# Altium integrated library ALTIUM-TBL_5_08_2535_HORIZONTAL_ENTRY_W_RISING_CAGE_69125351000x-rev17b.IntLib: 81 symbols
Pins are listed as number, name and electrical type; pins without a type are passive.

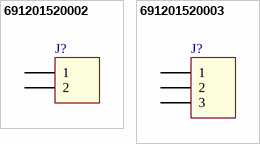
[diagram p0: symbols 691201520002 to 691201520003]

## 691201520002
designator J?
WR-TBL Serie 2015 - 5.08 mm 45° Entry Modular with Rising Cage Clamp, 2p; Part Number: 691201520002; Pitch: 5.08 mm; Pin Number: 2; ComponentLink1Description: Manufacturer; ComponentLink1URL: http://www.we-online.de; ComponentLink2Description: Datasheet; ComponentLink2URL: http://katalog.we-online.de/em/datasheet/6912015200XX.pdf; Published Date: March 2017; Publisher: Wurth Elektronik
footprint 691201520002 (Serie 2015 - 5.08 mm _ 2 pins)
pins: 1, 2

## 691201520003
designator J?
WR-TBL Serie 2015 - 5.08 mm 45° Entry Modular with Rising Cage Clamp, 3p; Part Number: 691201520003; Pitch: 5.08 mm; Pin Number: 3; ComponentLink1Description: Manufacturer; ComponentLink1URL: http://www.we-online.de; ComponentLink2Description: Datasheet; ComponentLink2URL: http://katalog.we-online.de/em/datasheet/6912015200XX.pdf; Published Date: March 2017; Publisher: Wurth Elektronik
footprint 691201520003 (Serie 2015 - 5.08 mm _ 3 pins)
pins: 1, 2, 3


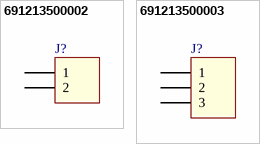
[diagram p1: symbols 691213500002 to 691213500003]

## 691213500002
designator J?
WR-TBL Serie 2135 - 5.08 mm Vertical Entry Modular with Rising Cage Clamp, 2p; Part Number: 691213500002; Pitch: 5.08 mm; Pin Number: 2; ComponentLink1Description: Manufacturer; ComponentLink1URL: http://www.we-online.de; ComponentLink2Description: Datasheet; ComponentLink2URL: http://katalog.we-online.de/em/datasheet/6912135000XX.pdf; Published Date: March 2017; Publisher: Wurth Elektronik
footprint 691213500002 (Serie 2135 - 5.08 mm _ 2 pins)
pins: 1, 2

## 691213500003
designator J?
WR-TBL Serie 2135 - 5.08 mm Vertical Entry Modular with Rising Cage Clamp, 3p; Part Number: 691213500003; Pitch: 5.08 mm; Pin Number: 3; ComponentLink1Description: Manufacturer; ComponentLink1URL: http://www.we-online.de; ComponentLink2Description: Datasheet; ComponentLink2URL: http://katalog.we-online.de/em/datasheet/6912135000XX.pdf; Published Date: March 2017; Publisher: Wurth Elektronik
footprint 691213500003 (Serie 2135 - 5.08 mm_ 3 pins)
pins: 1, 2, 3


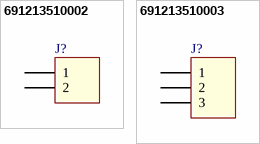
[diagram p2: symbols 691213510002 to 691213510003]

## 691213510002
designator J?
WR-TBL Serie 2135 - 5.08 mm Horizontal Entry Modular with Rising Cage Clamp, 2p; Part Number: 691213510002; Pitch: 5.08 mm; Pin Number: 2; ComponentLink1Description: Manufacturer; ComponentLink1URL: http://www.we-online.de; ComponentLink2Description: Datasheet; ComponentLink2URL: http://katalog.we-online.de/em/datasheet/6912135100XX.pdf; Published Date: March 2017; Publisher: Wurth Elektronik
footprint 691213510002 (Serie 2135 - 5.08 mm _ 2 pins)
pins: 1, 2

## 691213510003
designator J?
WR-TBL Serie 2135 - 5.08 mm Horizontal Entry Modular with Rising Cage Clamp, 3p; Part Number: 691213510003; Pitch: 5.08 mm; Pin Number: 3; ComponentLink1Description: Manufacturer; ComponentLink1URL: http://www.we-online.de; ComponentLink2Description: Datasheet; ComponentLink2URL: http://katalog.we-online.de/em/datasheet/6912135100XX.pdf; Published Date: March 2017; Publisher: Wurth Elektronik
footprint 691213510003 (Serie 2135 - 5.08 mm _ 3 pins)
pins: 1, 2, 3


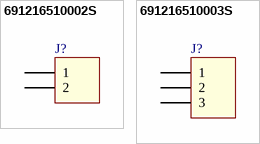
[diagram p3: symbols 691216510002S to 691216510003S]

## 691216510002S
designator J?
WR-TBL Serie 2165 S - 5.08 mm Horizontal Entry Modular with Rising Cage Clamp, 2p; Part Number: 691216510002S; Pitch: 5.08 mm; Pin Number: 2; ComponentLink1Description: Manufacturer; ComponentLink1URL: http://www.we-online.de; ComponentLink2Description: Datasheet; ComponentLink2URL: http://katalog.we-online.de/em/datasheet/6912165100XXS.pdf; Published Date: March 2017; Publisher: Wurth Elektronik
footprint 691216510002S (Serie 2165S - 5.08 mm _ 2 pins)
pins: 1, 2

## 691216510003S
designator J?
WR-TBL Serie 2165 S - 5.08 mm Horizontal Entry Modular with Rising Cage Clamp, 3p; Part Number: 691216510003S; Pitch: 5.08 mm; Pin Number: 3; ComponentLink1Description: Manufacturer; ComponentLink1URL: http://www.we-online.de; ComponentLink2Description: Datasheet; ComponentLink2URL: http://katalog.we-online.de/em/datasheet/6912165100XXS.pdf; Published Date: March 2017; Publisher: Wurth Elektronik
footprint 691216510003S (Serie 2165S - 5.08 mm _ 3 pins)
pins: 1, 2, 3


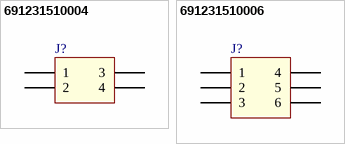
[diagram p4: symbols 691231510004 to 691231510006]

## 691231510004
designator J?
WR-TBL Serie 2315 - 5.08 mm Double Level, H=19.01mm, Horizontal Entry Modular with Rising Cage, 4p; Part Number: 691231510004; Pitch: 5.08 mm; Pin Number: 4; ComponentLink1Description: Manufacturer; ComponentLink1URL: http://www.we-online.de; ComponentLink2Description: Datasheet; ComponentLink2URL: http://katalog.we-online.de/em/datasheet/6912315100xx.pdf; Published Date: March 2017; Publisher: Wurth Elektronik
footprint 691231510004 (5,08mm - modular - 2 rows - Right - horizontal entry with rising cage clamp - 04p - h=19,1mm)
pins: 1, 2, 3, 4

## 691231510006
designator J?
WR-TBL Serie 2315 - 5.08 mm Double Level, H=19.01mm, Horizontal Entry Modular with Rising Cage, 6p; Part Number: 691231510006; Pitch: 5.08 mm; Pin Number: 6; ComponentLink1Description: Manufacturer; ComponentLink1URL: http://www.we-online.de; ComponentLink2Description: Datasheet; ComponentLink2URL: http://katalog.we-online.de/em/datasheet/6912315100xx.pdf; Published Date: March 2017; Publisher: Wurth Elektronik
footprint 691231510006 (5,08mm - modular - 2 rows - Right - horizontal entry with rising cage clamp - 06p - h=19,1mm)
pins: 1, 2, 3, 4, 5, 6


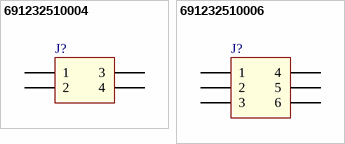
[diagram p5: symbols 691232510004 to 691232510006]

## 691232510004
designator J?
WR-TBL Serie 2325 - 5.08 mm Double Level, H=25.03mm, Horizontal Entry Modular with Rising Cage, 4p; Part Number: 691232510004; Pitch: 5.08 mm; Pin Number: 4; ComponentLink1Description: Manufacturer; ComponentLink1URL: http://www.we-online.de; ComponentLink2Description: Datasheet; ComponentLink2URL: http://katalog.we-online.de/em/datasheet/6912325100xx.pdf; Published Date: March 2017; Publisher: Wurth Elektronik
footprint 691232510004 (5,08mm - modular - 2 rows - Right - horizontal entry with rising cage clamp - 04p - h=25,3mm)
pins: 1, 2, 3, 4

## 691232510006
designator J?
WR-TBL Serie 2325 - 5.08 mm Double Level, H=25.03mm, Horizontal Entry Modular with Rising Cage, 6p; Part Number: 691232510006; Pitch: 5.08 mm; Pin Number: 6; ComponentLink1Description: Manufacturer; ComponentLink1URL: http://www.we-online.de; ComponentLink2Description: Datasheet; ComponentLink2URL: http://katalog.we-online.de/em/datasheet/6912325100xx.pdf; Published Date: March 2017; Publisher: Wurth Elektronik
footprint 691232510006 (5,08mm - modular - 2 rows - Right - horizontal entry with rising cage clamp - 06p - h=25,3mm)
pins: 1, 2, 3, 4, 5, 6


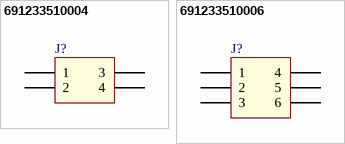
[diagram p6: symbols 691233510004 to 691233510006]

## 691233510004
designator J?
WR-TBL Serie 2335 - 5.08 mm Double Level, H=31.05mm, Horizontal Entry Modular with Rising Cage, 4p; Part Number: 691233510004; Pitch: 5.08 mm; Pin Number: 4; ComponentLink1Description: Manufacturer; ComponentLink1URL: http://www.we-online.de; ComponentLink2Description: Datasheet; ComponentLink2URL: http://katalog.we-online.de/em/datasheet/6912335100XX.pdf; Published Date: March 2017; Publisher: Wurth Elektronik
footprint 691233510004 (5,08mm - modular - 2 rows - Right - horizontal entry with rising cage clamp - 04p - h=31,5mm)
pins: 1, 2, 3, 4

## 691233510006
designator J?
WR-TBL Serie 2335 - 5.08 mm Double Level, H=31.05mm, Horizontal Entry Modular with Rising Cage, 6p; Part Number: 691233510006; Pitch: 5.08 mm; Pin Number: 6; ComponentLink1Description: Manufacturer; ComponentLink1URL: http://www.we-online.de; ComponentLink2Description: Datasheet; ComponentLink2URL: http://katalog.we-online.de/em/datasheet/6912335100XX.pdf; Published Date: March 2017; Publisher: Wurth Elektronik
footprint 691233510006 (5,08mm - modular - 2 rows - Right - horizontal entry with rising cage clamp - 06p - h=31,5mm)
pins: 1, 2, 3, 4, 5, 6


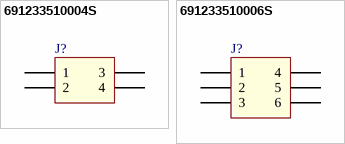
[diagram p7: symbols 691233510004S to 691233510006S]

## 691233510004S
designator J?
WR-TBL Serie 2335 S - 5.08 mm Horizontal Entry with Rising Cage Clamp, 4p; Part Number: 691233510004S; Pitch: 5.08 mm; Pin Number: 4; ComponentLink1Description: Manufacturer; ComponentLink1URL: http://www.we-online.de; ComponentLink2Description: Datasheet; ComponentLink2URL: http://katalog.we-online.de/em/datasheet/691233510004S.pdf; Published Date: April 2017; Publisher: Wurth Elektronik
footprint 691233510004S (5.08 mm Horizontal Entry with Rising Cage Clamp, 4p)
pins: 1, 2, 3, 4

## 691233510006S
designator J?
WR-TBL Serie 2335 S - 5.08 mm Horizontal Entry with Rising Cage Clamp, 6p; Part Number: 691233510006S; Pitch: 5.08 mm; Pin Number: 6; ComponentLink1Description: Manufacturer; ComponentLink1URL: http://www.we-online.de; ComponentLink2Description: Datasheet; ComponentLink2URL: http://katalog.we-online.de/em/datasheet/691233510004S.pdf; Published Date: April 2017; Publisher: Wurth Elektronik
footprint 691233510006S (5.08 mm Horizontal Entry with Rising Cage Clamp, 6p)
pins: 1, 2, 3, 4, 5, 6


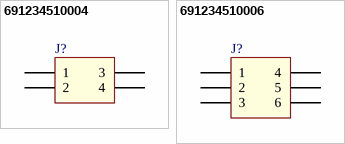
[diagram p8: symbols 691234510004 to 691234510006]

## 691234510004
designator J?
WR-TBL Serie 2345 - 5.08 mm Horizontal Entry with Rising Cage Clamp, 4p; Part Number: 691234510004; Pitch: 5.08 mm; Pin Number: 4; ComponentLink1Description: Manufacturer; ComponentLink1URL: http://www.we-online.de; ComponentLink2Description: Datasheet; ComponentLink2URL: http://katalog.we-online.de/em/datasheet/6912345100xx.pdf; Published Date: March 2017; Publisher: Wurth Elektronik
footprint 691234510004 (Horizontal Cable Entry with Rising Cage Clamp, pitch 5.08mm, 04p)
pins: 1, 2, 3, 4

## 691234510006
designator J?
WR-TBL Serie 2345 - 5.08 mm Horizontal Entry with Rising Cage Clamp, 6p; Part Number: 691234510006; Pitch: 5.08 mm; Pin Number: 6; ComponentLink1Description: Manufacturer; ComponentLink1URL: http://www.we-online.de; ComponentLink2Description: Datasheet; ComponentLink2URL: http://katalog.we-online.de/em/datasheet/6912345100xx.pdf; Published Date: March 2017; Publisher: Wurth Elektronik
footprint 691234510006 (Horizontal Cable Entry with Rising Cage Clamp, pitch 5.08mm, 06p)
pins: 1, 2, 3, 4, 5, 6


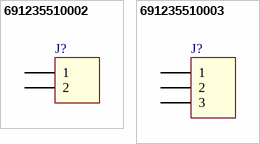
[diagram p9: symbols 691235510002 to 691235510003]

## 691235510002
designator J?
WR-TBL Serie 2355 - 5.08 mm Horizontal Entry with Rising Cage Clamp, 2p; Part Number: 691235510002; Pitch: 5.08 mm; Pin Number: 2; ComponentLink1Description: Manufacturer; ComponentLink1URL: http://www.we-online.de; ComponentLink2Description: Datasheet; ComponentLink2URL: http://katalog.we-online.de/em/datasheet/6912355100xx.pdf; Published Date: March 2017; Publisher: Wurth Elektronik
footprint 691235510002 (Horizontal Cable Entry with Rising Cage Clamp, pitch 5.08, 02p)
pins: 1, 2

## 691235510003
designator J?
WR-TBL Serie 2355 - 5.08 mm Horizontal Entry with Rising Cage Clamp, 3p; Part Number: 691235510003; Pitch: 5.08 mm; Pin Number: 3; ComponentLink1Description: Manufacturer; ComponentLink1URL: http://www.we-online.de; ComponentLink2Description: Datasheet; ComponentLink2URL: http://katalog.we-online.de/em/datasheet/6912355100xx.pdf; Published Date: March 2017; Publisher: Wurth Elektronik
footprint 691235510003 (Horizontal Cable Entry with Rising Cage Clamp, pitch 5.08, 03p)
pins: 1, 2, 3


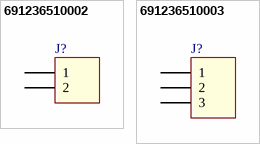
[diagram p10: symbols 691236510002 to 691236510003]

## 691236510002
designator J?
WR-TBL Serie 2365 - 5.08 mm Horizontal Entry with Rising Cage Clamp, 2p; Part Number: 691236510002; Pitch: 5.08 mm; Pin Number: 2; ComponentLink1Description: Manufacturer; ComponentLink1URL: http://www.we-online.de; ComponentLink2Description: Datasheet; ComponentLink2URL: http://katalog.we-online.de/em/datasheet/6912365100xx.pdf; Published Date: March 2017; Publisher: Wurth Elektronik
footprint 691236510002 (Horizontal Cable Entry with Rising Cage Clamp, pitch 5.08mm, 02p)
pins: 1, 2

## 691236510003
designator J?
WR-TBL Serie 2365 - 5.08 mm Horizontal Entry with Rising Cage Clamp, 3p; Part Number: 691236510003; Pitch: 5.08 mm; Pin Number: 3; ComponentLink1Description: Manufacturer; ComponentLink1URL: http://www.we-online.de; ComponentLink2Description: Datasheet; ComponentLink2URL: http://katalog.we-online.de/em/datasheet/6912365100xx.pdf; Published Date: March 2017; Publisher: Wurth Elektronik
footprint 691236510003 (Horizontal Cable Entry with Rising Cage Clamp, pitch 5.08mm, 03p)
pins: 1, 2, 3


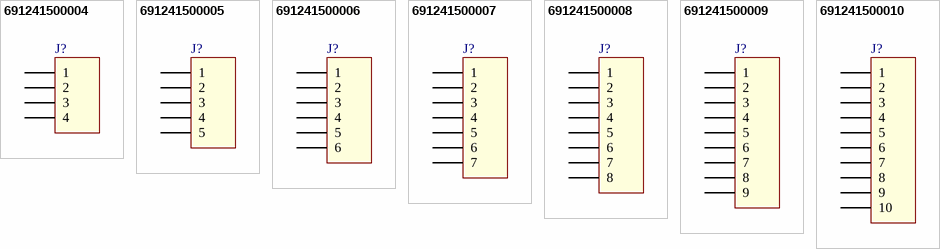
[diagram p11: symbols 691241500004 to 691241500010]

## 691241500004
designator J?
WR-TBL Serie 2415 - 5.08 mm Vertical Entry Modular with Rising Cage Clamp, 4p; Part Number: 691241500004; Pitch: 5.08 mm; Pin Number: 4; ComponentLink1Description: Manufacturer; ComponentLink1URL: http://www.we-online.de; ComponentLink2Description: Datasheet; ComponentLink2URL: http://katalog.we-online.de/em/datasheet/6912415000xx.pdf; Published Date: March 2017; Publisher: Wurth Elektronik
footprint 691241500004 (Serie 2415-5.08mm Vertical Cable Entry with Rising Cage Clamp, 4 pins)
pins: 1, 2, 3, 4

## 691241500005
designator J?
WR-TBL Serie 2415 - 5.08 mm Vertical Entry Modular with Rising Cage Clamp, 5p; Part Number: 691241500005; Pitch: 5.08 mm; Pin Number: 5; ComponentLink1Description: Manufacturer; ComponentLink1URL: http://www.we-online.de; ComponentLink2Description: Datasheet; ComponentLink2URL: http://katalog.we-online.de/em/datasheet/6912415000xx.pdf; Published Date: March 2017; Publisher: Wurth Elektronik
footprint 691241500005 (Serie 2415-5.08mm Vertical Cable Entry with Rising Cage Clamp, 5 pins)
pins: 1, 2, 3, 4, 5

## 691241500006
designator J?
WR-TBL Serie 2415 - 5.08 mm Vertical Entry Modular with Rising Cage Clamp, 6p; Part Number: 691241500006; Pitch: 5.08 mm; Pin Number: 6; ComponentLink1Description: Manufacturer; ComponentLink1URL: http://www.we-online.de; ComponentLink2Description: Datasheet; ComponentLink2URL: http://katalog.we-online.de/em/datasheet/6912415000xx.pdf; Published Date: March 2017; Publisher: Wurth Elektronik
footprint 691241500006 (Serie 2415-5.08mm Vertical Cable Entry with Rising Cage Clamp, 6 pins)
pins: 1, 2, 3, 4, 5, 6

## 691241500007
designator J?
WR-TBL Serie 2415 - 5.08 mm Vertical Entry Modular with Rising Cage Clamp, 7p; Part Number: 691241500007; Pitch: 5.08 mm; Pin Number: 7; ComponentLink1Description: Manufacturer; ComponentLink1URL: http://www.we-online.de; ComponentLink2Description: Datasheet; ComponentLink2URL: http://katalog.we-online.de/em/datasheet/6912415000xx.pdf; Published Date: March 2017; Publisher: Wurth Elektronik
footprint 691241500007 (Serie 2415-5.08mm Vertical Cable Entry with Rising Cage Clamp, 7 pins)
pins: 1, 2, 3, 4, 5, 6, 7

## 691241500008
designator J?
WR-TBL Serie 2415 - 5.08 mm Vertical Entry Modular with Rising Cage Clamp, 8p; Part Number: 691241500008; Pitch: 5.08 mm; Pin Number: 8; ComponentLink1Description: Manufacturer; ComponentLink1URL: http://www.we-online.de; ComponentLink2Description: Datasheet; ComponentLink2URL: http://katalog.we-online.de/em/datasheet/6912415000xx.pdf; Published Date: March 2017; Publisher: Wurth Elektronik
footprint 691241500008 (Serie 2415-5.08mm Vertical Cable Entry with Rising Cage Clamp, 8 pins)
pins: 1, 2, 3, 4, 5, 6, 7, 8

## 691241500009
designator J?
WR-TBL Serie 2415 - 5.08 mm Vertical Entry Modular with Rising Cage Clamp, 9p; Part Number: 691241500009; Pitch: 5.08 mm; Pin Number: 9; ComponentLink1Description: Manufacturer; ComponentLink1URL: http://www.we-online.de; ComponentLink2Description: Datasheet; ComponentLink2URL: http://katalog.we-online.de/em/datasheet/6912415000xx.pdf; Published Date: March 2017; Publisher: Wurth Elektronik
footprint 691241500009 (Serie 2415-5.08mm Vertical Cable Entry with Rising Cage Clamp, 9 pins)
pins: 1, 2, 3, 4, 5, 6, 7, 8, 9

## 691241500010
designator J?
WR-TBL Serie 2415 - 5.08 mm Vertical Entry Modular with Rising Cage Clamp, 10p; Part Number: 691241500010; Pitch: 5.08 mm; Pin Number: 10; ComponentLink1Description: Manufacturer; ComponentLink1URL: http://www.we-online.de; ComponentLink2Description: Datasheet; ComponentLink2URL: http://katalog.we-online.de/em/datasheet/6912415000xx.pdf; Published Date: March 2017; Publisher: Wurth Elektronik
footprint 691241500010 (Serie 2415-5.08mm Vertical Cable Entry with Rising Cage Clamp, 10 pins)
pins: 1, 2, 3, 4, 5, 6, 7, 8, 9, 10


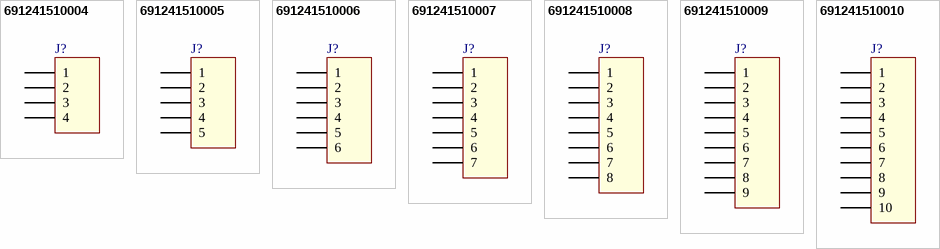
[diagram p12: symbols 691241510004 to 691241510010]

## 691241510004
designator J?
WR-TBL Serie 2415 - 5.08 mm Horizontal Entry Modular with Rising Cage Clamp, 4p; Part Number: 691241510004; Pitch: 5.08 mm; Pin Number: 4; ComponentLink1Description: Manufacturer; ComponentLink1URL: http://www.we-online.de; ComponentLink2Description: Datasheet; ComponentLink2URL: http://katalog.we-online.de/em/datasheet/6912415100xx.pdf; Published Date: March 2017; Publisher: Wurth Elektronik
footprint 691241510004 (Serie 2415 - 5.08 mm _ 4 pins)
pins: 1, 2, 3, 4

## 691241510005
designator J?
WR-TBL Serie 2415 - 5.08 mm Horizontal Entry Modular with Rising Cage Clamp, 5p; Part Number: 691241510005; Pitch: 5.08 mm; Pin Number: 5; ComponentLink1Description: Manufacturer; ComponentLink1URL: http://www.we-online.de; ComponentLink2Description: Datasheet; ComponentLink2URL: http://katalog.we-online.de/em/datasheet/6912415100xx.pdf; Published Date: March 2017; Publisher: Wurth Elektronik
footprint 691241510005 (Serie 2415 - 5.08 mm _ 5 pins)
pins: 1, 2, 3, 4, 5

## 691241510006
designator J?
WR-TBL Serie 2415 - 5.08 mm Horizontal Entry Modular with Rising Cage Clamp, 6p; Part Number: 691241510006; Pitch: 5.08 mm; Pin Number: 6; ComponentLink1Description: Manufacturer; ComponentLink1URL: http://www.we-online.de; ComponentLink2Description: Datasheet; ComponentLink2URL: http://katalog.we-online.de/em/datasheet/6912415100xx.pdf; Published Date: March 2017; Publisher: Wurth Elektronik
footprint 691241510006 (Serie 2415 - 5.08 mm _ 6 pins)
pins: 1, 2, 3, 4, 5, 6

## 691241510007
designator J?
WR-TBL Serie 2415 - 5.08 mm Horizontal Entry Modular with Rising Cage Clamp, 7p; Part Number: 691241510007; Pitch: 5.08 mm; Pin Number: 7; ComponentLink1Description: Manufacturer; ComponentLink1URL: http://www.we-online.de; ComponentLink2Description: Datasheet; ComponentLink2URL: http://katalog.we-online.de/em/datasheet/6912415100xx.pdf; Published Date: March 2017; Publisher: Wurth Elektronik
footprint 691241510007 (Serie 2415 - 5.08 mm _ 7 pins)
pins: 1, 2, 3, 4, 5, 6, 7

## 691241510008
designator J?
WR-TBL Serie 2415 - 5.08 mm Horizontal Entry Modular with Rising Cage Clamp, 8p; Part Number: 691241510008; Pitch: 5.08 mm; Pin Number: 8; ComponentLink1Description: Manufacturer; ComponentLink1URL: http://www.we-online.de; ComponentLink2Description: Datasheet; ComponentLink2URL: http://katalog.we-online.de/em/datasheet/6912415100xx.pdf; Published Date: March 2017; Publisher: Wurth Elektronik
footprint 691241510008 (Serie 2415 - 5.08 mm _ 8 pins)
pins: 1, 2, 3, 4, 5, 6, 7, 8

## 691241510009
designator J?
WR-TBL Serie 2415 - 5.08 mm Horizontal Entry Modular with Rising Cage Clamp, 9p; Part Number: 691241510009; Pitch: 5.08 mm; Pin Number: 9; ComponentLink1Description: Manufacturer; ComponentLink1URL: http://www.we-online.de; ComponentLink2Description: Datasheet; ComponentLink2URL: http://katalog.we-online.de/em/datasheet/6912415100xx.pdf; Published Date: March 2017; Publisher: Wurth Elektronik
footprint 691241510009 (Serie 2415 - 5.08 mm _ 9 pins)
pins: 1, 2, 3, 4, 5, 6, 7, 8, 9

## 691241510010
designator J?
WR-TBL Serie 2415 - 5.08 mm Horizontal Entry Modular with Rising Cage Clamp, 10p; Part Number: 691241510010; Pitch: 5.08 mm; Pin Number: 10; ComponentLink1Description: Manufacturer; ComponentLink1URL: http://www.we-online.de; ComponentLink2Description: Datasheet; ComponentLink2URL: http://katalog.we-online.de/em/datasheet/6912415100xx.pdf; Published Date: March 2017; Publisher: Wurth Elektronik
footprint 691241510010 (Serie 2415 - 5.08 mm _ 10 pins)
pins: 1, 2, 3, 4, 5, 6, 7, 8, 9, 10


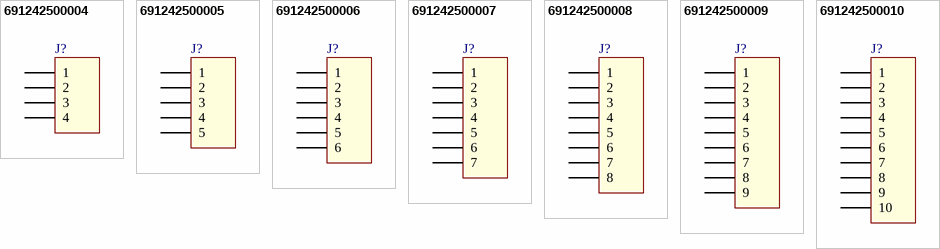
[diagram p13: symbols 691242500004 to 691242500010]

## 691242500004
designator J?
WR-TBL Serie 2425 - 5.08 mm Vertical Entry with Rising Cage Clamp, 4p; Part Number: 691242500004; Pitch: 5.08 mm; Pin Number: 4; ComponentLink1Description: Manufacturer; ComponentLink1URL: http://www.we-online.de; ComponentLink2Description: Datasheet; ComponentLink2URL: http://katalog.we-online.de/em/datasheet/6912425000xx.pdf; Published Date: March 2017; Publisher: Wurth Elektronik
footprint 691242500004 (Serie 2425-5.08mm Vertical Cable Entry with Rising Cage Clamp, 4 pins)
pins: 1, 2, 3, 4

## 691242500005
designator J?
WR-TBL Serie 2425 - 5.08 mm Vertical Entry with Rising Cage Clamp, 5p; Part Number: 691242500005; Pitch: 5.08 mm; Pin Number: 5; ComponentLink1Description: Manufacturer; ComponentLink1URL: http://www.we-online.de; ComponentLink2Description: Datasheet; ComponentLink2URL: http://katalog.we-online.de/em/datasheet/6912425000xx.pdf; Published Date: March 2017; Publisher: Wurth Elektronik
footprint 691242500005 (Serie 2425-5.08mm Vertical Cable Entry with Rising Cage Clamp, 5 pins)
pins: 1, 2, 3, 4, 5

## 691242500006
designator J?
WR-TBL Serie 2425 - 5.08 mm Vertical Entry with Rising Cage Clamp, 6p; Part Number: 691242500006; Pitch: 5.08 mm; Pin Number: 6; ComponentLink1Description: Manufacturer; ComponentLink1URL: http://www.we-online.de; ComponentLink2Description: Datasheet; ComponentLink2URL: http://katalog.we-online.de/em/datasheet/6912425000xx.pdf; Published Date: March 2017; Publisher: Wurth Elektronik
footprint 691242500006 (Serie 2425-5.08mm Vertical Cable Entry with Rising Cage Clamp, 6 pins)
pins: 1, 2, 3, 4, 5, 6

## 691242500007
designator J?
WR-TBL Serie 2425 - 5.08 mm Vertical Entry with Rising Cage Clamp, 7p; Part Number: 691242500007; Pitch: 5.08 mm; Pin Number: 7; ComponentLink1Description: Manufacturer; ComponentLink1URL: http://www.we-online.de; ComponentLink2Description: Datasheet; ComponentLink2URL: http://katalog.we-online.de/em/datasheet/6912425000xx.pdf; Published Date: March 2017; Publisher: Wurth Elektronik
footprint 691242500007 (Serie 2425-5.08mm Vertical Cable Entry with Rising Cage Clamp, 7 pins)
pins: 1, 2, 3, 4, 5, 6, 7

## 691242500008
designator J?
WR-TBL Serie 2425 - 5.08 mm Vertical Entry with Rising Cage Clamp, 8p; Part Number: 691242500008; Pitch: 5.08 mm; Pin Number: 8; ComponentLink1Description: Manufacturer; ComponentLink1URL: http://www.we-online.de; ComponentLink2Description: Datasheet; ComponentLink2URL: http://katalog.we-online.de/em/datasheet/6912425000xx.pdf; Published Date: March 2017; Publisher: Wurth Elektronik
footprint 691242500008 (Serie 2425-5.08mm Vertical Cable Entry with Rising Cage Clamp, 8 pins)
pins: 1, 2, 3, 4, 5, 6, 7, 8

## 691242500009
designator J?
WR-TBL Serie 2425 - 5.08 mm Vertical Entry with Rising Cage Clamp, 9p; Part Number: 691242500009; Pitch: 5.08 mm; Pin Number: 9; ComponentLink1Description: Manufacturer; ComponentLink1URL: http://www.we-online.de; ComponentLink2Description: Datasheet; ComponentLink2URL: http://katalog.we-online.de/em/datasheet/6912425000xx.pdf; Published Date: March 2017; Publisher: Wurth Elektronik
footprint 691242500009 (Serie 2425-5.08mm Vertical Cable Entry with Rising Cage Clamp, 9 pins)
pins: 1, 2, 3, 4, 5, 6, 7, 8, 9

## 691242500010
designator J?
WR-TBL Serie 2425 - 5.08 mm Vertical Entry with Rising Cage Clamp, 10p; Part Number: 691242500010; Pitch: 5.08 mm; Pin Number: 10; ComponentLink1Description: Manufacturer; ComponentLink1URL: http://www.we-online.de; ComponentLink2Description: Datasheet; ComponentLink2URL: http://katalog.we-online.de/em/datasheet/6912425000xx.pdf; Published Date: March 2017; Publisher: Wurth Elektronik
footprint 691242500010 (Serie 2425-5.08mm Vertical Cable Entry with Rising Cage Clamp, 10 pins)
pins: 1, 2, 3, 4, 5, 6, 7, 8, 9, 10


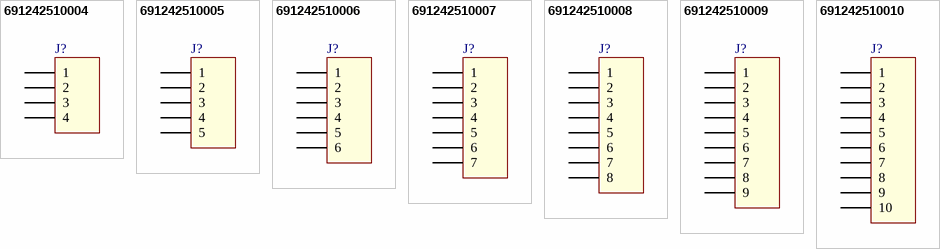
[diagram p14: symbols 691242510004 to 691242510010]

## 691242510004
designator J?
WR-TBL Serie 2425 - 5.08 mm Horizontal Entry Modular with Rising Cage Clamp, 4p; Part Number: 691242510004; Pitch: 5.08 mm; Pin Number: 4; ComponentLink1Description: Manufacturer; ComponentLink1URL: http://www.we-online.de; ComponentLink2Description: Datasheet; ComponentLink2URL: http://katalog.we-online.de/em/datasheet/6912425100xx.pdf; Published Date: March 2017; Publisher: Wurth Elektronik
footprint 691242510004 (Serie 2425 - 5.08 mm _ 4 pins)
pins: 1, 2, 3, 4

## 691242510005
designator J?
WR-TBL Serie 2425 - 5.08 mm Horizontal Entry Modular with Rising Cage Clamp, 5p; Part Number: 691242510005; Pitch: 5.08 mm; Pin Number: 5; ComponentLink1Description: Manufacturer; ComponentLink1URL: http://www.we-online.de; ComponentLink2Description: Datasheet; ComponentLink2URL: http://katalog.we-online.de/em/datasheet/6912425100xx.pdf; Published Date: March 2017; Publisher: Wurth Elektronik
footprint 691242510005 (Serie 2425 - 5.08 mm _ 5 pins)
pins: 1, 2, 3, 4, 5

## 691242510006
designator J?
WR-TBL Serie 2425 - 5.08 mm Horizontal Entry Modular with Rising Cage Clamp, 6p; Part Number: 691242510006; Pitch: 5.08 mm; Pin Number: 6; ComponentLink1Description: Manufacturer; ComponentLink1URL: http://www.we-online.de; ComponentLink2Description: Datasheet; ComponentLink2URL: http://katalog.we-online.de/em/datasheet/6912425100xx.pdf; Published Date: March 2017; Publisher: Wurth Elektronik
footprint 691242510006 (Serie 2425 - 5.08 mm _ 6 pins)
pins: 1, 2, 3, 4, 5, 6

## 691242510007
designator J?
WR-TBL Serie 2425 - 5.08 mm Horizontal Entry Modular with Rising Cage Clamp, 7p; Part Number: 691242510007; Pitch: 5.08 mm; Pin Number: 7; ComponentLink1Description: Manufacturer; ComponentLink1URL: http://www.we-online.de; ComponentLink2Description: Datasheet; ComponentLink2URL: http://katalog.we-online.de/em/datasheet/6912425100xx.pdf; Published Date: March 2017; Publisher: Wurth Elektronik
footprint 691242510007 (Serie 2425 - 5.08 mm _ 7 pins)
pins: 1, 2, 3, 4, 5, 6, 7

## 691242510008
designator J?
WR-TBL Serie 2425 - 5.08 mm Horizontal Entry Modular with Rising Cage Clamp, 8p; Part Number: 691242510008; Pitch: 5.08 mm; Pin Number: 8; ComponentLink1Description: Manufacturer; ComponentLink1URL: http://www.we-online.de; ComponentLink2Description: Datasheet; ComponentLink2URL: http://katalog.we-online.de/em/datasheet/6912425100xx.pdf; Published Date: March 2017; Publisher: Wurth Elektronik
footprint 691242510008 (Serie 2425 - 5.08 mm _ 8 pins)
pins: 1, 2, 3, 4, 5, 6, 7, 8

## 691242510009
designator J?
WR-TBL Serie 2425 - 5.08 mm Horizontal Entry Modular with Rising Cage Clamp, 9p; Part Number: 691242510009; Pitch: 5.08 mm; Pin Number: 9; ComponentLink1Description: Manufacturer; ComponentLink1URL: http://www.we-online.de; ComponentLink2Description: Datasheet; ComponentLink2URL: http://katalog.we-online.de/em/datasheet/6912425100xx.pdf; Published Date: March 2017; Publisher: Wurth Elektronik
footprint 691242510009 (Serie 2425 - 5.08 mm _ 9 pins)
pins: 1, 2, 3, 4, 5, 6, 7, 8, 9

## 691242510010
designator J?
WR-TBL Serie 2425 - 5.08 mm Horizontal Entry Modular with Rising Cage Clamp, 10p; Part Number: 691242510010; Pitch: 5.08 mm; Pin Number: 10; ComponentLink1Description: Manufacturer; ComponentLink1URL: http://www.we-online.de; ComponentLink2Description: Datasheet; ComponentLink2URL: http://katalog.we-online.de/em/datasheet/6912425100xx.pdf; Published Date: March 2017; Publisher: Wurth Elektronik
footprint 691242510010 (Serie 2425 - 5.08 mm _ 10 pins)
pins: 1, 2, 3, 4, 5, 6, 7, 8, 9, 10


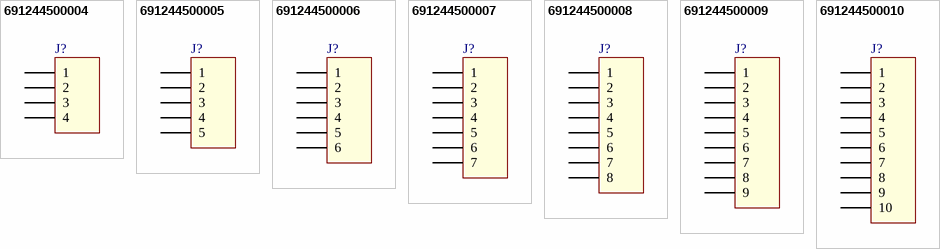
[diagram p15: symbols 691244500004 to 691244500010]

## 691244500004
designator J?
WR-TBL Serie 2445 - 5.08 mm Vertical Entry Modular with Rising Cage Clamp, 4p; Part Number: 691244500004; Pitch: 5.08 mm; Pin Number: 4; ComponentLink1Description: Manufacturer; ComponentLink1URL: http://www.we-online.de; ComponentLink2Description: Datasheet; ComponentLink2URL: http://katalog.we-online.de/em/datasheet/6912445000XX.pdf; Published Date: March 2017; Publisher: Wurth Elektronik
footprint 691244500004 (Serie 2445 - 5.08 mm _ 4 pins)
pins: 1, 2, 3, 4

## 691244500005
designator J?
WR-TBL Serie 2445 - 5.08 mm Vertical Entry Modular with Rising Cage Clamp, 5p; Part Number: 691244500005; Pitch: 5.08 mm; Pin Number: 5; ComponentLink1Description: Manufacturer; ComponentLink1URL: http://www.we-online.de; ComponentLink2Description: Datasheet; ComponentLink2URL: http://katalog.we-online.de/em/datasheet/6912445000XX.pdf; Published Date: March 2017; Publisher: Wurth Elektronik
footprint 691244500005 (Serie 2445 - 5.08 mm _ 5 pins)
pins: 1, 2, 3, 4, 5

## 691244500006
designator J?
WR-TBL Serie 2445 - 5.08 mm Vertical Entry Modular with Rising Cage Clamp, 6p; Part Number: 691244500006; Pitch: 5.08 mm; Pin Number: 6; ComponentLink1Description: Manufacturer; ComponentLink1URL: http://www.we-online.de; ComponentLink2Description: Datasheet; ComponentLink2URL: http://katalog.we-online.de/em/datasheet/6912445000XX.pdf; Published Date: March 2017; Publisher: Wurth Elektronik
footprint 691244500006 (Serie 2445 - 5.08 mm _ 6 pins)
pins: 1, 2, 3, 4, 5, 6

## 691244500007
designator J?
WR-TBL Serie 2445 - 5.08 mm Vertical Entry Modular with Rising Cage Clamp, 7p; Part Number: 691244500007; Pitch: 5.08 mm; Pin Number: 7; ComponentLink1Description: Manufacturer; ComponentLink1URL: http://www.we-online.de; ComponentLink2Description: Datasheet; ComponentLink2URL: http://katalog.we-online.de/em/datasheet/6912445000XX.pdf; Published Date: March 2017; Publisher: Wurth Elektronik
footprint 691244500007 (Serie 2445 - 5.08 mm _ 7 pins)
pins: 1, 2, 3, 4, 5, 6, 7

## 691244500008
designator J?
WR-TBL Serie 2445 - 5.08 mm Vertical Entry Modular with Rising Cage Clamp, 8p; Part Number: 691244500008; Pitch: 5.08 mm; Pin Number: 8; ComponentLink1Description: Manufacturer; ComponentLink1URL: http://www.we-online.de; ComponentLink2Description: Datasheet; ComponentLink2URL: http://katalog.we-online.de/em/datasheet/6912445000XX.pdf; Published Date: March 2017; Publisher: Wurth Elektronik
footprint 691244500008 (Serie 2445 - 5.08 mm _ 8 pins)
pins: 1, 2, 3, 4, 5, 6, 7, 8

## 691244500009
designator J?
WR-TBL Serie 2445 - 5.08 mm Vertical Entry Modular with Rising Cage Clamp, 9p; Part Number: 691244500009; Pitch: 5.08 mm; Pin Number: 9; ComponentLink1Description: Manufacturer; ComponentLink1URL: http://www.we-online.de; ComponentLink2Description: Datasheet; ComponentLink2URL: http://katalog.we-online.de/em/datasheet/6912445000XX.pdf; Published Date: March 2017; Publisher: Wurth Elektronik
footprint 691244500009 (Serie 2445 - 5.08 mm _ 9 pins)
pins: 1, 2, 3, 4, 5, 6, 7, 8, 9

## 691244500010
designator J?
WR-TBL Serie 2445 - 5.08 mm Vertical Entry Modular with Rising Cage Clamp, 10p; Part Number: 691244500010; Pitch: 5.08 mm; Pin Number: 10; ComponentLink1Description: Manufacturer; ComponentLink1URL: http://www.we-online.de; ComponentLink2Description: Datasheet; ComponentLink2URL: http://katalog.we-online.de/em/datasheet/6912445000XX.pdf; Published Date: March 2017; Publisher: Wurth Elektronik
footprint 691244500010 (Serie 2445 - 5.08 mm _ 10 pins)
pins: 1, 2, 3, 4, 5, 6, 7, 8, 9, 10


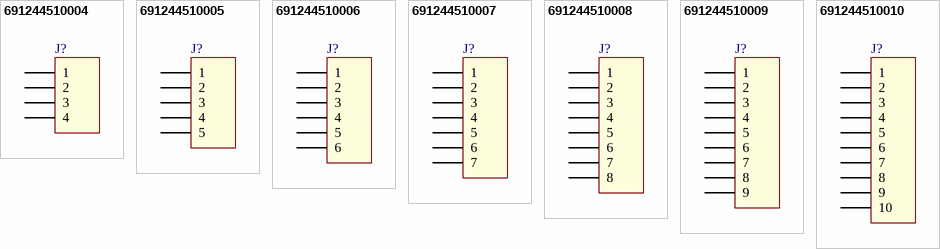
[diagram p16: symbols 691244510004 to 691244510010]

## 691244510004
designator J?
WR-TBL Serie 2445 - 5.08 mm Horizontal Entry Modular with Rising Cage Clamp, 4p; Part Number: 691244510004; Pitch: 5.08 mm; Pin Number: 4; ComponentLink1Description: Manufacturer; ComponentLink1URL: http://www.we-online.de; ComponentLink2Description: Datasheet; ComponentLink2URL: http://katalog.we-online.de/em/datasheet/6912445100XX.pdf; Published Date: March 2017; Publisher: Wurth Elektronik
footprint 691244510004 (Serie 2445 - 5.08 mm _ 4 pins)
pins: 1, 2, 3, 4

## 691244510005
designator J?
WR-TBL Serie 2445 - 5.08 mm Horizontal Entry Modular with Rising Cage Clamp, 5p; Part Number: 691244510005; Pitch: 5.08 mm; Pin Number: 5; ComponentLink1Description: Manufacturer; ComponentLink1URL: http://www.we-online.de; ComponentLink2Description: Datasheet; ComponentLink2URL: http://katalog.we-online.de/em/datasheet/6912445100XX.pdf; Published Date: March 2017; Publisher: Wurth Elektronik
footprint 691244510005 (Serie 2445 - 5.08 mm _ 5 pins)
pins: 1, 2, 3, 4, 5

## 691244510006
designator J?
WR-TBL Serie 2445 - 5.08 mm Horizontal Entry Modular with Rising Cage Clamp, 6p; Part Number: 691244510006; Pitch: 5.08 mm; Pin Number: 6; ComponentLink1Description: Manufacturer; ComponentLink1URL: http://www.we-online.de; ComponentLink2Description: Datasheet; ComponentLink2URL: http://katalog.we-online.de/em/datasheet/6912445100XX.pdf; Published Date: March 2017; Publisher: Wurth Elektronik
footprint 691244510006 (Serie 2445 - 5.08 mm _ 6 pins)
pins: 1, 2, 3, 4, 5, 6

## 691244510007
designator J?
WR-TBL Serie 2445 - 5.08 mm Horizontal Entry Modular with Rising Cage Clamp, 7p; Part Number: 691244510007; Pitch: 5.08 mm; Pin Number: 7; ComponentLink1Description: Manufacturer; ComponentLink1URL: http://www.we-online.de; ComponentLink2Description: Datasheet; ComponentLink2URL: http://katalog.we-online.de/em/datasheet/6912445100XX.pdf; Published Date: March 2017; Publisher: Wurth Elektronik
footprint 691244510007 (Serie 2445 - 5.08 mm _ 7 pins)
pins: 1, 2, 3, 4, 5, 6, 7

## 691244510008
designator J?
WR-TBL Serie 2445 - 5.08 mm Horizontal Entry Modular with Rising Cage Clamp, 8p; Part Number: 691244510008; Pitch: 5.08 mm; Pin Number: 8; ComponentLink1Description: Manufacturer; ComponentLink1URL: http://www.we-online.de; ComponentLink2Description: Datasheet; ComponentLink2URL: http://katalog.we-online.de/em/datasheet/6912445100XX.pdf; Published Date: March 2017; Publisher: Wurth Elektronik
footprint 691244510008 (Serie 2445 - 5.08 mm _ 8 pins)
pins: 1, 2, 3, 4, 5, 6, 7, 8

## 691244510009
designator J?
WR-TBL Serie 2445 - 5.08 mm Horizontal Entry Modular with Rising Cage Clamp, 9p; Part Number: 691244510009; Pitch: 5.08 mm; Pin Number: 9; ComponentLink1Description: Manufacturer; ComponentLink1URL: http://www.we-online.de; ComponentLink2Description: Datasheet; ComponentLink2URL: http://katalog.we-online.de/em/datasheet/6912445100XX.pdf; Published Date: March 2017; Publisher: Wurth Elektronik
footprint 691244510009 (Serie 2445 - 5.08 mm _ 9 pins)
pins: 1, 2, 3, 4, 5, 6, 7, 8, 9

## 691244510010
designator J?
WR-TBL Serie 2445 - 5.08 mm Horizontal Entry Modular with Rising Cage Clamp, 10p; Part Number: 691244510010; Pitch: 5.08 mm; Pin Number: 10; ComponentLink1Description: Manufacturer; ComponentLink1URL: http://www.we-online.de; ComponentLink2Description: Datasheet; ComponentLink2URL: http://katalog.we-online.de/em/datasheet/6912445100XX.pdf; Published Date: March 2017; Publisher: Wurth Elektronik
footprint 691244510010 (Serie 2445 - 5.08 mm _ 10 pins)
pins: 1, 2, 3, 4, 5, 6, 7, 8, 9, 10


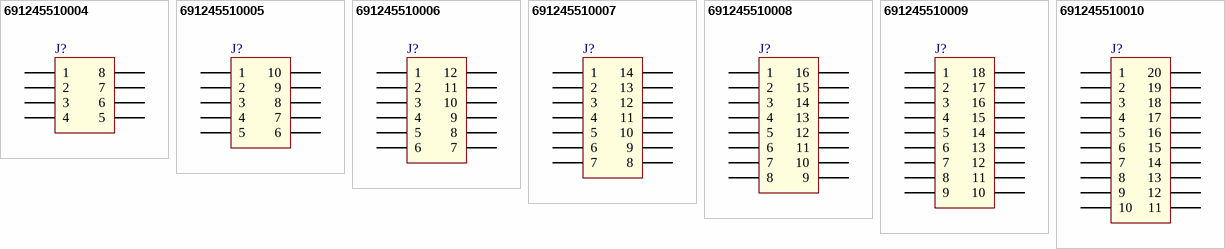
[diagram p17: symbols 691245510004 to 691245510010]

## 691245510004
designator J?
WR-TBL Serie 2455 - 5.08 mm Horizontal Cable Entry with Rising Cage, 4p; Part Number: 691245510004; Pitch: 5.08 mm; Pin Number: 4; ComponentLink1Description: Manufacturer; ComponentLink1URL: http://www.we-online.de; ComponentLink2Description: Datasheet; ComponentLink2URL: http://katalog.we-online.de/em/datasheet/6912455100xx.pdf; Published Date: March 2017; Publisher: Wurth Elektronik
footprint 691245510004 (Serie 2455-5.08mm Horizontal Cable Entry with Rising Cage Clamp, 4 pins)
pins: 1, 2, 3, 4, 5, 6, 7, 8

## 691245510005
designator J?
WR-TBL Serie 2455 - 5.08 mm Horizontal Cable Entry with Rising Cage, 5p; Part Number: 691245510005; Pitch: 5.08 mm; Pin Number: 5; ComponentLink1Description: Manufacturer; ComponentLink1URL: http://www.we-online.de; ComponentLink2Description: Datasheet; ComponentLink2URL: http://katalog.we-online.de/em/datasheet/6912455100xx.pdf; Published Date: March 2017; Publisher: Wurth Elektronik
footprint 691245510005 (Serie 2455-5.08mm Horizontal Cable Entry with Rising Cage Clamp, 5 pins)
pins: 1, 2, 3, 4, 5, 6, 7, 8, 9, 10

## 691245510006
designator J?
WR-TBL Serie 2455 - 5.08 mm Horizontal Cable Entry with Rising Cage, 6p; Part Number: 691245510006; Pitch: 5.08 mm; Pin Number: 6; ComponentLink1Description: Manufacturer; ComponentLink1URL: http://www.we-online.de; ComponentLink2Description: Datasheet; ComponentLink2URL: http://katalog.we-online.de/em/datasheet/6912455100xx.pdf; Published Date: March 2017; Publisher: Wurth Elektronik
footprint 691245510006 (Serie 2455-5.08mm Horizontal Cable Entry with Rising Cage Clamp, 6 pins)
pins: 1, 2, 3, 4, 5, 6, 7, 8, 9, 10, 11, 12

## 691245510007
designator J?
WR-TBL Serie 2455 - 5.08 mm Horizontal Cable Entry with Rising Cage, 7p; Part Number: 691245510007; Pitch: 5.08 mm; Pin Number: 7; ComponentLink1Description: Manufacturer; ComponentLink1URL: http://www.we-online.de; ComponentLink2Description: Datasheet; ComponentLink2URL: http://katalog.we-online.de/em/datasheet/6912455100xx.pdf; Published Date: March 2017; Publisher: Wurth Elektronik
footprint 691245510007 (Serie 2455-5.08mm Horizontal Cable Entry with Rising Cage Clamp, 7 pins)
pins: 1, 2, 3, 4, 5, 6, 7, 8, 9, 10, 11, 12, 13, 14

## 691245510008
designator J?
WR-TBL Serie 2455 - 5.08 mm Horizontal Cable Entry with Rising Cage, 8p; Part Number: 691245510008; Pitch: 5.08 mm; Pin Number: 8; ComponentLink1Description: Manufacturer; ComponentLink1URL: http://www.we-online.de; ComponentLink2Description: Datasheet; ComponentLink2URL: http://katalog.we-online.de/em/datasheet/6912455100xx.pdf; Published Date: March 2017; Publisher: Wurth Elektronik
footprint 691245510008 (Serie 2455-5.08mm Horizontal Cable Entry with Rising Cage Clamp, 8 pins)
pins: 1, 2, 3, 4, 5, 6, 7, 8, 9, 10, 11, 12, 13, 14, 15, 16

## 691245510009
designator J?
WR-TBL Serie 2455 - 5.08 mm Horizontal Cable Entry with Rising Cage, 9p; Part Number: 691245510009; Pitch: 5.08 mm; Pin Number: 9; ComponentLink1Description: Manufacturer; ComponentLink1URL: http://www.we-online.de; ComponentLink2Description: Datasheet; ComponentLink2URL: http://katalog.we-online.de/em/datasheet/6912455100xx.pdf; Published Date: March 2017; Publisher: Wurth Elektronik
footprint 691245510009 (Serie 2455-5.08mm Horizontal Cable Entry with Rising Cage Clamp, 9 pins)
pins: 1, 2, 3, 4, 5, 6, 7, 8, 9, 10, 11, 12, 13, 14, 15, 16, 17, 18

## 691245510010
designator J?
WR-TBL Serie 2455 - 5.08 mm Horizontal Cable Entry with Rising Cage, 10p; Part Number: 691245510010; Pitch: 5.08 mm; Pin Number: 10; ComponentLink1Description: Manufacturer; ComponentLink1URL: http://www.we-online.de; ComponentLink2Description: Datasheet; ComponentLink2URL: http://katalog.we-online.de/em/datasheet/6912455100xx.pdf; Published Date: March 2017; Publisher: Wurth Elektronik
footprint 691245510010 (Serie 2455-5.08mm Horizontal Cable Entry with Rising Cage Clamp, 10 pins)
pins: 1, 2, 3, 4, 5, 6, 7, 8, 9, 10, 11, 12, 13, 14, 15, 16, 17, 18, 19, 20


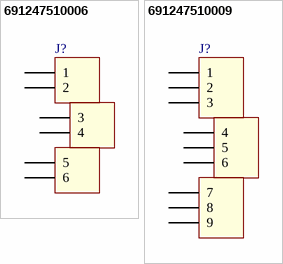
[diagram p18: symbols 691247510006 to 691247510009]

## 691247510006
designator J?
WR-TBL Serie 2475 - 5.08 mm Horizontal Entry with Rising Cage Clamp, 6p; Part Number: 691247510006; Pitch: 5.08 mm; Pin Number: 6; ComponentLink1Description: Manufacturer; ComponentLink1URL: http://www.we-online.de; ComponentLink2Description: Datasheet; ComponentLink2URL: http://katalog.we-online.de/em/datasheet/6912475100xx.pdf; Published Date: March 2017; Publisher: Wurth Elektronik
footprint 691247510006 (5.08mm Horizontal Cable Entry with Rising Cage Clamp, 06p)
pins: 1, 2, 3, 4, 5, 6

## 691247510009
designator J?
WR-TBL Serie 2475 - 5.08 mm Horizontal Entry with Rising Cage Clamp, 9p; Part Number: 691247510009; Pitch: 5.08 mm; Pin Number: 9; ComponentLink1Description: Manufacturer; ComponentLink1URL: http://www.we-online.de; ComponentLink2Description: Datasheet; ComponentLink2URL: http://katalog.we-online.de/em/datasheet/6912475100xx.pdf; Published Date: March 2017; Publisher: Wurth Elektronik
footprint 691247510009 (5.08mm Horizontal Cable Entry with Rising Cage Clamp, 09p)
pins: 1, 2, 3, 4, 5, 6, 7, 8, 9


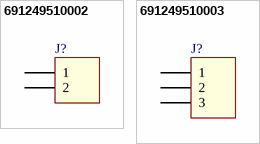
[diagram p19: symbols 691249510002 to 691249510003]

## 691249510002
designator J?
WR-TBL Serie 2495 - 5.08 mm Horizontal Entry with Rising Cage Clamp, 2p; Part Number: 691249510002; Pitch: 5.08 mm; Pin Number: 2; ComponentLink1Description: Manufacturer; ComponentLink1URL: http://www.we-online.de; ComponentLink2Description: Datasheet; ComponentLink2URL: http://katalog.we-online.de/em/datasheet/6912495100xx.pdf; Published Date: March 2017; Publisher: Wurth Elektronik
footprint 691249510002 (5.08mm Horizontal Cable Entry with Rising Cage Clamp, 02p)
pins: 1, 2

## 691249510003
designator J?
WR-TBL Serie 2495 - 5.08 mm Horizontal Entry with Rising Cage Clamp, 3p; Part Number: 691249510003; Pitch: 5.08 mm; Pin Number: 3; ComponentLink1Description: Manufacturer; ComponentLink1URL: http://www.we-online.de; ComponentLink2Description: Datasheet; ComponentLink2URL: http://katalog.we-online.de/em/datasheet/6912495100xx.pdf; Published Date: March 2017; Publisher: Wurth Elektronik
footprint 691249510003 (5.08mm Horizontal Cable Entry with Rising Cage Clamp, 03p)
pins: 1, 2, 3


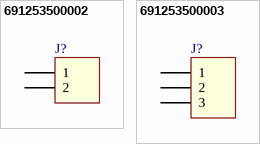
[diagram p20: symbols 691253500002 to 691253500003]

## 691253500002
designator J?
WR-TBL Serie 2535 - 5.08 mm Vertical Entry Modular with Rising Cage Clamp, 2p; Part Number: 691253500002; Pitch: 5.08 mm; Pin Number: 2; ComponentLink1Description: Manufacturer; ComponentLink1URL: http://www.we-online.de; ComponentLink2Description: Datasheet; ComponentLink2URL: http://katalog.we-online.de/em/datasheet/6912535000XX.pdf; Published Date: March 2017; Publisher: Wurth Elektronik
footprint 691253500002 (Serie 2535 - 5.08 mm _ 2 pins)
pins: 1, 2

## 691253500003
designator J?
WR-TBL Serie 2535 - 5.08 mm Vertical Entry Modular with Rising Cage Clamp, 3p; Part Number: 691253500003; Pitch: 5.08 mm; Pin Number: 3; ComponentLink1Description: Manufacturer; ComponentLink1URL: http://www.we-online.de; ComponentLink2Description: Datasheet; ComponentLink2URL: http://katalog.we-online.de/em/datasheet/6912535000XX.pdf; Published Date: March 2017; Publisher: Wurth Elektronik
footprint 691253500003 (Serie 2535 - 5.08 mm _ 3 pins)
pins: 1, 2, 3


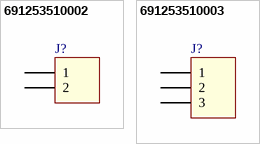
[diagram p21: symbols 691253510002 to 691253510003]

## 691253510002
designator J?
WR-TBL Serie 2535 - 5.08 mm Horizontal Cable Entry with Rising Cage Clamp, 2p; Part Number: 691253510002; Pitch: 5.08 mm; Pin Number: 2; ComponentLink1Description: Manufacturer; ComponentLink1URL: http://www.we-online.de; ComponentLink2Description: Datasheet; ComponentLink2URL: http://katalog.we-online.de/em/datasheet/6912535100xx.pdf; Published Date: March 2017; Publisher: Wurth Elektronik
footprint 691253510002 (Serie 2535 - 5.08 mm _ 2 pins)
pins: 1, 2

## 691253510003
designator J?
WR-TBL Serie 2535 - 5.08 mm Horizontal Cable Entry with Rising Cage Clamp, 3p; Part Number: 691253510003; Pitch: 5.08 mm; Pin Number: 3; ComponentLink1Description: Manufacturer; ComponentLink1URL: http://www.we-online.de; ComponentLink2Description: Datasheet; ComponentLink2URL: http://katalog.we-online.de/em/datasheet/6912535100xx.pdf; Published Date: March 2017; Publisher: Wurth Elektronik
footprint 691253510003 (Serie 2535 - 5.08 mm _ 3 pins)
pins: 1, 2, 3


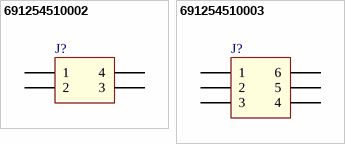
[diagram p22: symbols 691254510002 to 691254510003]

## 691254510002
designator J?
WR-TBL Serie 2545 - 5.08 mm Horizontal Cable Entry with Rising Cage, 2p; Part Number: 691254510002; Pitch: 5.08 mm; Pin Number: 2; ComponentLink1Description: Manufacturer; ComponentLink1URL: http://www.we-online.de; ComponentLink2Description: Datasheet; ComponentLink2URL: http://katalog.we-online.de/em/datasheet/6912545100xx.pdf; Published Date: March 2017; Publisher: Wurth Elektronik
footprint 691254510002 (Serie 2545-5.08mm Horizontal Cable Entry with Rising Cage Clamp, 2 pins)
pins: 1, 2, 3, 4

## 691254510003
designator J?
WR-TBL Serie 2545 - 5.08 mm Horizontal Cable Entry with Rising Cage, 3p; Part Number: 691254510003; Pitch: 5.08 mm; Pin Number: 3; ComponentLink1Description: Manufacturer; ComponentLink1URL: http://www.we-online.de; ComponentLink2Description: Datasheet; ComponentLink2URL: http://katalog.we-online.de/em/datasheet/6912545100xx.pdf; Published Date: March 2017; Publisher: Wurth Elektronik
footprint 691254510003 (Serie 2545-5.08mm Horizontal Cable Entry with Rising Cage Clamp, 3 pins)
pins: 1, 2, 3, 4, 5, 6